# Altium footprint library TranDangKhoa-LIB.PcbLib: 1435 footprints (part 22 of 90)
Each footprint in its own frame and in the unit in brackets; x right, y up, seen from the top. Pads: shape width x height; smd on the part's side, far side on the other; paste and mask are expansions set on the pad; w line width, h text height; cw(c..) or ccw(c..) is an arc to the next point about the centre after c.
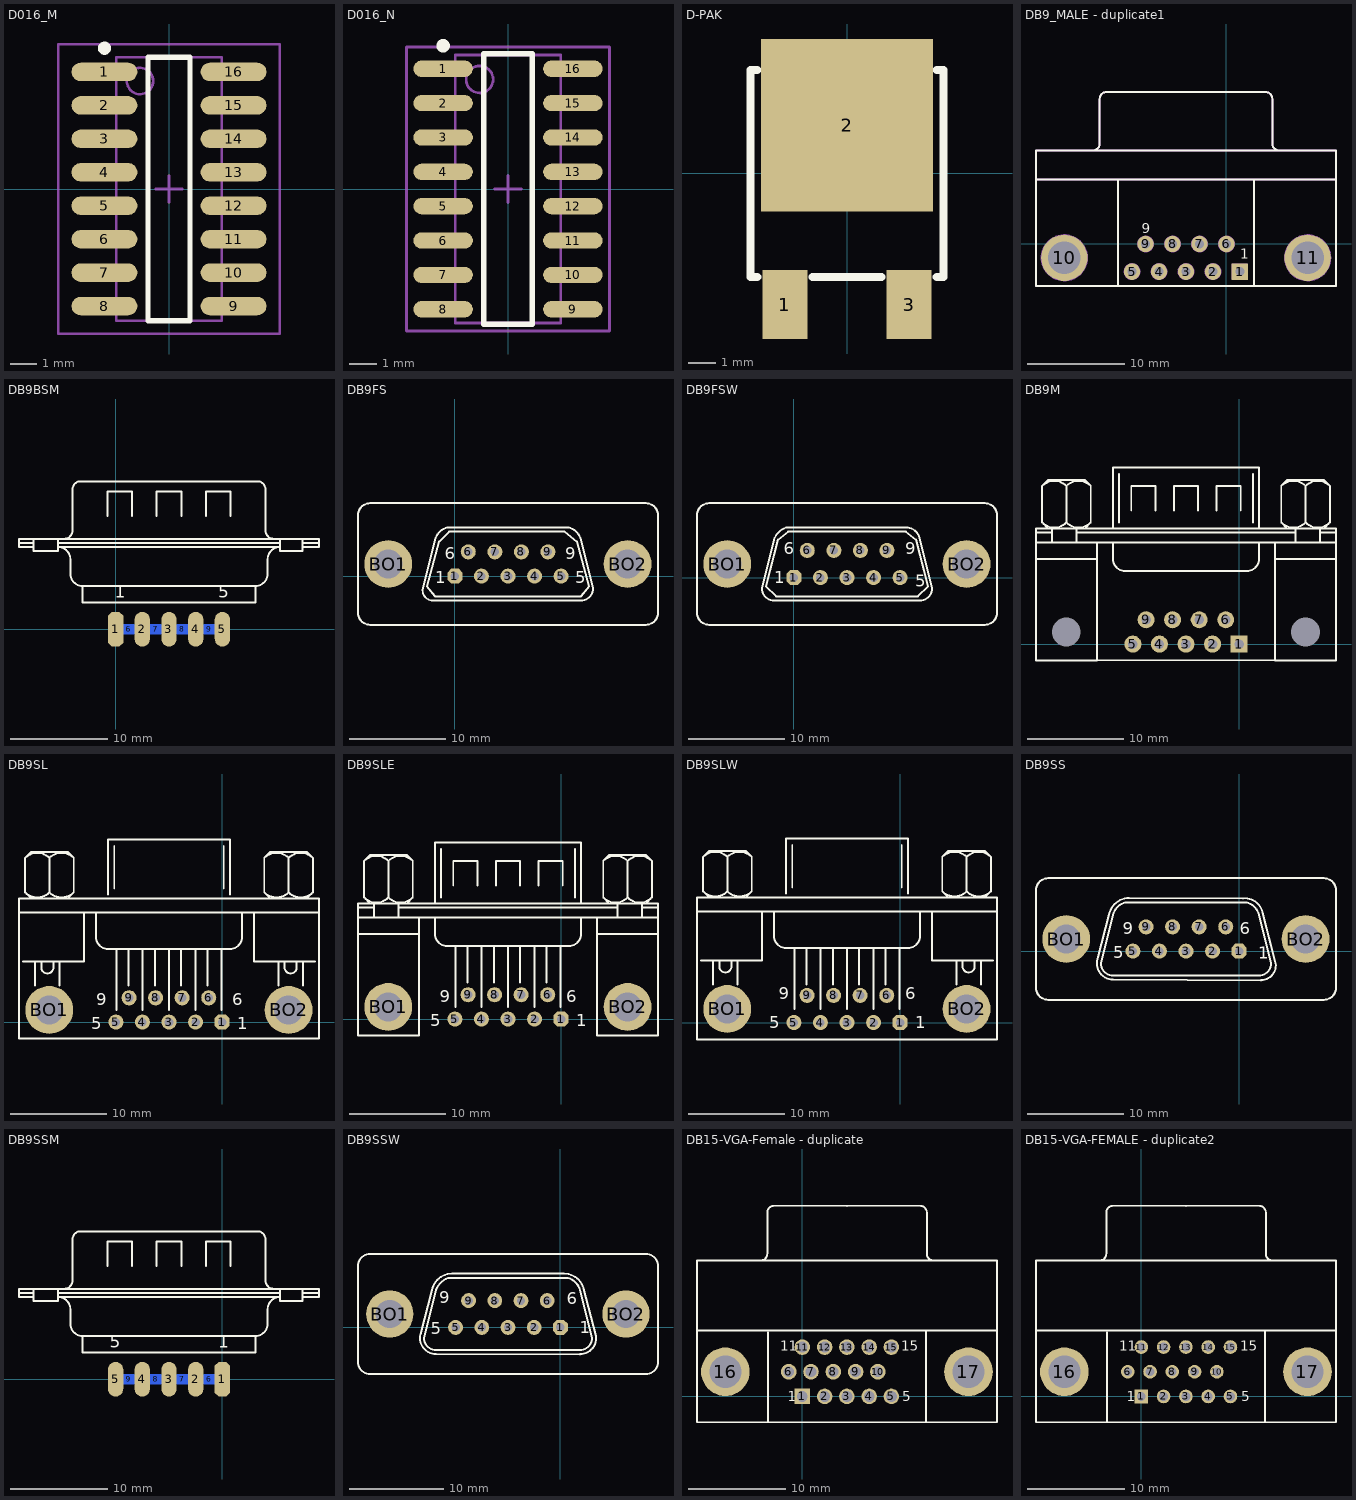
[diagram p21: the footprints below, top view; thin cyan lines are the x and y axes]

## D016_M [mm] "SOIC, 16-Leads, Body 9.9x3.9mm, Pitch 1.27mm, IPC Low Density"
height 1.75
pads (16):
  oval 2.5x0.7 smd: 1(-2.45,4.445) 2(-2.45,3.175) 3(-2.45,1.905) 4(-2.45,0.635) 5(-2.45,-0.635) 6(-2.45,-1.905) 7(-2.45,-3.175) 8(-2.45,-4.445) 9(2.45,-4.445) 10(2.45,-3.175) 11(2.45,-1.905) 12(2.45,-0.635) 13(2.45,0.635) 14(2.45,1.905) 15(2.45,3.175) 16(2.45,4.445)
Top Overlay:
  circle w0.25: c-2.45,5.345 r0.125
  lines w0.2: -0.8,-5 0.8,-5 0.8,5 -0.8,5 -0.8,-5
Mechanical 13:
  circle w0.1: c-1.1,4.1 r0.5
  lines w0.1: -2,-5 2,-5 2,5 -2,5 -2,-5
Mechanical 15:
  lines w0.1: -0.5,0 0.5,0 ; 0,-0.5 0,0.5 ; -4.2,-5.5 4.2,-5.5 4.2,5.5 -4.2,5.5 -4.2,-5.5
3D body: height 1.75, standoff 0, extent -2,-5 2,5

## D016_N [mm] "SOIC, 16-Leads, Body 9.9x3.9mm, Pitch 1.27mm, IPC Medium Density"
height 1.75
pads (16):
  oval 2.2x0.6 smd: 1(-2.4,4.445) 2(-2.4,3.175) 3(-2.4,1.905) 4(-2.4,0.635) 5(-2.4,-0.635) 6(-2.4,-1.905) 7(-2.4,-3.175) 8(-2.4,-4.445) 9(2.4,-4.445) 10(2.4,-3.175) 11(2.4,-1.905) 12(2.4,-0.635) 13(2.4,0.635) 14(2.4,1.905) 15(2.4,3.175) 16(2.4,4.445)
Top Overlay:
  circle w0.25: c-2.4,5.295 r0.125
  lines w0.2: -0.9,-5 0.9,-5 0.9,5 -0.9,5 -0.9,-5
Mechanical 13:
  circle w0.1: c-1.05,4.05 r0.5
  lines w0.1: -1.95,-4.95 1.95,-4.95 1.95,4.95 -1.95,4.95 -1.95,-4.95
Mechanical 15:
  lines w0.1: -0.5,0 0.5,0 ; 0,-0.5 0,0.5 ; -3.75,-5.25 3.75,-5.25 3.75,5.25 -3.75,5.25 -3.75,-5.25
3D body: height 1.75, standoff 0, extent -1.95,-4.95 1.95,4.95

## D-PAK [mil]
pads (3):
  rect 65x100 smd: 1(-90,-190) 3(90,-190)
  rect 250x250 smd: 2(0,70)
Top Overlay:
  lines w12: -130,-150 -140,-150 -140,150 -130,150 ; -50,-150 50,-150 ; 130,-150 140,-150 140,150 130,150
3D body "User Library-TO252AA.step": height 90.55, standoff -0.35, extent -130,-210.95 129.06,170.95

## DB9_MALE - duplicate1 [mm]
pads (11):
  rect 1.69x1.69 hole 0.9: 1(1.385,-2.84)
  round 1.69 hole 0.9: 2(-1.385,-2.84) 3(-4.155,-2.84) 4(-6.925,-2.84) 5(-9.695,-2.84) 6(0,0) 7(-2.77,0) 8(-5.54,0) 9(-8.31,0)
  round 4.76 hole 3.3: 10(-16.65,-1.42) 11(8.34,-1.42)
Top Overlay:
  lines w0.2: -19.555,6.604 11.245,6.604 ; -13.715,9.609 ccw(c-13.715,10.304) -13.02,10.304 -13.02,14.904 ; -13.015,14.909 cw(c-12.32,14.909) -12.32,15.604 4.01,15.604 cw(c4.01,14.909) 4.705,14.909 ; -11.155,-4.32 -11.155,6.604 ; 2.845,-4.32 2.845,6.604 ; 4.71,14.904 4.71,10.304 ccw(c5.405,10.304) 5.405,9.609 ; -19.555,-4.32 -19.555,9.604 11.245,9.604 11.245,-4.32 -19.555,-4.32
  text "1" at 1.4,-1.5 h1
  text "9" at -8.709,1.095 h1
Mechanical 7:
  circle w0.2: c-1.385,-2.84 r0.773
  circle w0.2: c-4.155,-2.84 r0.773
  circle w0.2: c-6.925,-2.84 r0.773
  circle w0.2: c-9.695,-2.84 r0.773
  circle w0.2: c-8.31,0 r0.773
  circle w0.2: c-5.54,0 r0.773
  circle w0.2: c-2.77,0 r0.773
  circle w0.2: c0,0 r0.773
  circle w0.2: c8.34,-1.42 r2.327
  circle w0.2: c-16.65,-1.42 r2.327
  lines w0.2: -19.555,6.604 11.245,6.604 ; -13.715,9.609 ccw(c-13.715,10.304) -13.02,10.304 -13.02,14.904 ; -13.015,14.909 cw(c-12.32,14.909) -12.32,15.604 4.01,15.604 cw(c4.01,14.909) 4.705,14.909 ; -11.155,-4.32 -11.155,6.604 ; 2.845,-4.32 2.845,6.604 ; 4.71,14.904 4.71,10.304 ccw(c5.405,10.304) 5.405,9.609 ; -19.555,-4.32 11.245,-4.32 11.245,9.604 -19.555,9.604 -19.555,-4.32 ; 0.635,-3.59 2.135,-3.59 2.135,-2.09 0.635,-2.09 0.635,-2.84 0.635,-3.59
3D body "SW3DPS-DB9RA_copy.STEP": height 12.66, standoff -3.39, extent -19.848,-4.328 11.466,16.376
3D body: height 4, standoff -3, extent -18.067,-1.549 -17.122,-1.095
3D body: height 4, standoff -3, extent -16.299,-1.641 -15.232,-0.912
3D body: height 4, standoff -3, extent 6.914,-1.537 7.981,-0.808
3D body: height 4, standoff -3, extent 8.804,-1.354 9.749,-0.899
3D body: height 4.5, standoff 4, extent 6.626,-0.892 10.169,5.789
3D body: height 4.5, standoff 4, extent -18.528,-1.113 -14.985,5.568

## DB9BSM [mm]
pads (9):
  oct 1.587x3.598 smd: 1(0,0)
  oval 1.587x3.598 smd: 2(2.752,0) 3(5.503,0) 4(8.255,0) 5(11.007,0)
  oval 2x1 smd far side: 6(1.376,0) 7(4.127,0) 8(6.879,0) 9(9.631,0)
Top Overlay:
  lines w0.203: -9.948,8.89 -8.467,8.89 ; -8.467,8.467 -9.948,8.467 -9.948,9.313 20.955,9.313 20.955,8.467 19.262,8.467 ; -8.467,9.313 -8.467,8.043 -5.927,8.043 -5.927,9.313 ; -5.927,8.89 16.933,8.89 ; -5.292,9.313 ccw(c-5.292,10.16) -4.445,10.16 -4.445,14.393 cw(c-3.598,14.393) -3.598,15.24 14.605,15.24 cw(c14.605,14.393) 15.452,14.393 15.452,10.16 ccw(c16.298,10.16) 16.298,9.313 ; -0.847,11.642 -0.847,14.182 1.693,14.182 1.693,11.642 ; 4.233,11.642 4.233,14.182 6.773,14.182 6.773,11.642 ; 9.313,11.642 9.313,14.182 11.853,14.182 11.853,11.642 ; 16.933,9.313 16.933,8.043 19.262,8.043 19.262,9.313 ; 19.262,8.89 20.955,8.89 ; -3.387,4.445 cw(c-3.387,5.715) -4.657,5.715 -4.657,7.197 ccw(c-5.927,7.197) -5.927,8.467 16.933,8.467 ccw(c16.933,7.197) 15.663,7.197 15.663,5.715 cw(c14.393,5.715) 14.393,4.445 ; -3.387,4.445 14.393,4.445 ; -3.387,4.445 -3.387,2.752 14.393,2.752 14.393,4.445
  text "5" at 10.583,3.26 h1.27
  text "1" at -0.085,3.26 h1.27

## DB9FS [mil]
pads (11):
  oct 62x62 hole 35: 1(0,0)
  round 62 hole 35: 2(109.17,0) 3(218.33,0) 4(327.5,0) 5(436.67,0) 6(55,100) 7(164.17,100) 8(273.33,100) 9(382.5,100)
  round 196.67 hole 118.33: BO1(-274.17,50) BO2(710,50)
Top Overlay:
  lines w8: -131.72,-50.22 ccw(c-90,-58.33) -81.89,-100.05 ; -131.67,-50 -81.67,150 ; -81.67,-100 518.33,-100 ccw(c518.33,-50) 568.33,-50 518.33,150 ; -81.3,149.86 cw(c-15,133.33) -31.53,199.64 ; -31.67,200 468.33,200 ; 468.2,199.64 cw(c451.67,133.33) 517.97,149.86 ; -398.33,-150 ccw(c-348.33,-150) -348.33,-200 785,-200 ccw(c785,-150) 835,-150 835,250 ccw(c785,250) 785,300 -348.33,300 ccw(c-348.33,250) -398.33,250 -398.33,-150 ; -115,-41.67 -81.67,-83.33 518.33,-83.33 551.67,-41.67 501.67,141.67 451.67,183.33 -23.33,183.33 -65,141.67 -115,-41.67
  text "9" at 454.03,70.2 h50
  text "6" at -41.67,70 h50
  text "5" at 494.63,-29.7 h50
  text "1" at -81.67,-30 h50

## DB9FSW [mil]
pads (11):
  oct 62x62 hole 35: 1(0,0)
  round 62 hole 35: 2(109.17,0) 3(218.33,0) 4(327.5,0) 5(436.67,0) 6(55,111.67) 7(164.17,111.67) 8(273.33,111.67) 9(382.5,111.67)
  round 196.67 hole 118.33: BO1(-274.17,55.83) BO2(710,55.83)
Top Overlay:
  lines w8: -398.33,255.83 cw(c-348.33,255.83) -348.33,305.83 785,305.83 cw(c785,255.83) 835,255.83 835,-144.17 cw(c785,-144.17) 785,-194.17 -348.33,-194.17 cw(c-348.33,-144.17) -398.33,-144.17 -398.33,264.17 ; -81.67,155.83 -131.67,-44.17 ccw(c-81.67,-44.17) -81.67,-94.17 518.33,-94.17 ccw(c518.33,-44.17) 568.33,-44.17 518.33,155.83 ; -78.99,163.03 cw(c-6.67,130.83) -31.13,206.12 ; -31.67,205.83 468.33,205.83 ; 468.23,206.09 cw(c460,147.5) 518.59,155.73 ; -115,-35.83 -65,155.83 -23.33,189.17 460,189.17 501.67,155.83 551.67,-35.83 510,-77.5 -73.33,-77.5 -115,-35.83
  text "6" at -41.67,95.83 h50
  text "1" at -81.67,-24.17 h50
  text "5" at 499.33,-37.97 h50
  text "9" at 458.33,95.83 h50

## DB9M [mil]
pads (11):
  rect 70x70 hole 39.37 unplated: 1(0,0)
  round 70 hole 39.37 unplated: 2(-109.17,0) 3(-218.33,0) 4(-327.5,0) 5(-436.67,0) 6(-55,100) 7(-164.17,100) 8(-273.33,100) 9(-382.5,100)
  round 70 hole 118.11 unplated: ""(-710.83,50) ""(273.33,50)
Top Overlay:
  lines w7.87: -619,-66.67 210,-66.67
  lines w8: -835,350 -585,350 ; -835,416.67 398.33,416.67 ; -835,458.33 -768.33,458.33 ; -810.09,499.91 ccw(c-760,550) -709.91,499.91 ; -810.09,650.09 cw(c-760,600) -709.91,650.09 ; -785,475 -810,500 -810,650 -785,675 -635,675 -610,650 -610,500 -635,475 ; -768.33,416.67 -768.33,475 ; -710.09,499.91 ccw(c-660,550) -609.91,499.91 ; -710.09,650.09 cw(c-660,600) -609.91,650.09 ; -710,500 -710,650 ; -668.33,416.67 -668.33,475 ; -668.33,458.33 231.67,458.33 ; -585,416.67 -585,-66.67 -835,-66.67 -835,475 398.33,475 398.33,-66.67 148.33,-66.67 148.33,416.67 ; -518.33,416.67 -518.33,350 ccw(c-468.33,350) -468.33,300 31.67,300 ccw(c31.67,350) 81.67,350 81.67,416.67 ; -518.33,475 -518.33,725 81.67,725 81.67,475 ; -493.33,500 -493.33,700 ; -443.33,550 -443.33,650 -343.33,650 -343.33,550 ; -268.33,550 -268.33,650 -168.33,650 -168.33,550 ; -93.33,550 -93.33,650 6.67,650 6.67,550 ; 56.67,500 56.67,700 ; 148.33,350 398.33,350 ; 173.25,499.91 ccw(c223.33,550) 273.42,499.91 ; 173.25,650.09 cw(c223.33,600) 273.42,650.09 ; 198.33,475 173.33,500 173.33,650 198.33,675 348.33,675 373.33,650 373.33,500 348.33,475 ; 231.67,416.67 231.67,475 ; 273.25,499.91 ccw(c323.33,550) 373.42,499.91 ; 273.25,650.09 cw(c323.33,600) 373.42,650.09 ; 273.33,500 273.33,650 ; 331.67,416.67 331.67,475 ; 331.67,458.33 398.33,458.33

## DB9SL [mil]
pads (11):
  oct 62x62 hole 35: 1(0,0)
  round 62 hole 35: 2(-109.17,0) 3(-218.33,0) 4(-327.5,0) 5(-436.67,0) 6(-55,100) 7(-164.17,100) 8(-273.33,100) 9(-382.5,100)
  round 196.67 hole 118.33: BO1(-710.83,50) BO2(273.33,50)
Top Overlay:
  lines w8: -835,450 398.33,450 ; -818.33,250 -568.33,250 -568.33,450 ; -810.09,533.25 ccw(c-760,583.33) -709.91,533.25 ; -810.09,675.09 cw(c-760,625) -709.91,675.09 ; -785,508.33 -810,533.33 -810,675 -785,700 -635,700 -610,675 -610,533.33 -635,508.33 ; -768.33,150 -768.33,250 ; -743.33,250 -743.33,225 ccw(c-718.33,225) -693.33,225 -693.33,250 ; -710.09,533.25 ccw(c-660,583.33) -609.91,533.25 ; -710.09,675.09 cw(c-660,625) -609.91,675.09 ; -710,533.33 -710,675 ; -668.33,150 -668.33,250 ; -518.33,450 -518.33,350 ccw(c-468.33,350) -468.33,300 31.67,300 ccw(c31.67,350) 81.67,350 81.67,450 ; -468.33,525 -468.33,750 31.67,750 31.67,525 ; -443.33,550 -443.33,725 ; -435,50 -435,300 ; -385,150 -385,300 ; -326.67,50 -326.67,300 ; -276.67,150 -276.67,300 ; -218.33,50 -218.33,300 ; -168.33,150 -168.33,300 ; -110,50 -110,300 ; -60,150 -60,158.33 -60,300 ; -1.67,50 -1.67,300 ; 6.67,550 6.67,725 ; 131.67,450 131.67,250 381.67,250 ; 173.25,533.25 ccw(c223.33,583.33) 273.42,533.25 ; 173.25,675.09 cw(c223.33,625) 273.42,675.09 ; 198.33,508.33 173.33,533.33 173.33,675 198.33,700 348.33,700 373.33,675 373.33,533.33 348.33,508.33 ; 231.67,150 231.67,250 ; 256.67,250 256.67,225 ccw(c281.67,225) 306.67,225 306.67,250 ; 273.25,533.25 ccw(c323.33,583.33) 373.42,533.25 ; 273.25,675.09 cw(c323.33,625) 373.42,675.09 ; 273.33,533.33 273.33,675 ; 331.67,150 331.67,250 ; -835,-66.67 -835,508.33 398.33,508.33 398.33,-66.67 -835,-66.67
  text "9" at -518.33,70 h50
  text "5" at -538.33,-30 h50
  text "1" at 61.67,-30 h50
  text "6" at 41.67,70 h50

## DB9SLE [mil]
pads (11):
  oct 62x62 hole 35: 1(0,0)
  round 62 hole 35: 2(-109.17,0) 3(-218.33,0) 4(-327.5,0) 5(-436.67,0) 6(-55,100) 7(-164.17,100) 8(-273.33,100) 9(-382.5,100)
  round 196.67 hole 118.33: BO1(-710.83,50) BO2(273.33,50)
Top Overlay:
  lines w8: -835,350 -585,350 ; -835,416.67 398.33,416.67 ; -835,458.33 -768.33,458.33 ; -810.09,499.91 ccw(c-760,550) -709.91,499.91 ; -810.09,650.09 cw(c-760,600) -709.91,650.09 ; -785,475 -810,500 -810,650 -785,675 -635,675 -610,650 -610,500 -635,475 ; -768.33,416.67 -768.33,475 ; -710.09,499.91 ccw(c-660,550) -609.91,499.91 ; -710.09,650.09 cw(c-660,600) -609.91,650.09 ; -710,500 -710,650 ; -668.33,416.67 -668.33,475 ; -668.33,458.33 231.67,458.33 ; -585,416.67 -585,-66.67 -835,-66.67 -835,475 398.33,475 398.33,-66.67 148.33,-66.67 148.33,416.67 ; -518.33,416.67 -518.33,350 ccw(c-468.33,350) -468.33,300 31.67,300 ccw(c31.67,350) 81.67,350 81.67,416.67 ; -518.33,475 -518.33,725 81.67,725 81.67,475 ; -493.33,500 -493.33,700 ; -443.33,550 -443.33,650 -343.33,650 -343.33,550 ; -435,50 -435,300 ; -385,150 -385,300 ; -326.67,50 -326.67,300 ; -276.67,150 -276.67,300 ; -268.33,550 -268.33,650 -168.33,650 -168.33,550 ; -218.33,50 -218.33,300 ; -168.33,150 -168.33,300 ; -110,50 -110,300 ; -93.33,550 -93.33,650 6.67,650 6.67,550 ; -60,150 -60,300 ; -1.67,50 -1.67,300 ; 56.67,500 56.67,700 ; 148.33,350 398.33,350 ; 173.25,499.91 ccw(c223.33,550) 273.42,499.91 ; 173.25,650.09 cw(c223.33,600) 273.42,650.09 ; 198.33,475 173.33,500 173.33,650 198.33,675 348.33,675 373.33,650 373.33,500 348.33,475 ; 231.67,416.67 231.67,475 ; 273.25,499.91 ccw(c323.33,550) 373.42,499.91 ; 273.25,650.09 cw(c323.33,600) 373.42,650.09 ; 273.33,500 273.33,650 ; 331.67,416.67 331.67,475 ; 331.67,458.33 398.33,458.33
  text "9" at -498.33,70 h50
  text "5" at -538.33,-30 h50
  text "6" at 21.67,70 h50
  text "1" at 61.67,-30 h50

## DB9SLW [mil]
pads (11):
  oct 62x62 hole 35: 1(0,0)
  round 62 hole 35: 2(-109.17,0) 3(-218.33,0) 4(-327.5,0) 5(-436.67,0) 6(-55,111.67) 7(-164.17,111.67) 8(-273.33,111.67) 9(-382.5,111.67)
  round 196.67 hole 118.33: BO1(-710.83,55.83) BO2(273.33,55.83)
Top Overlay:
  lines w8: -835,455.83 398.33,455.83 ; -818.33,255.83 -568.33,255.83 -568.33,455.83 ; -810.09,539.08 ccw(c-760,589.17) -709.91,539.08 ; -810.09,680.92 cw(c-760,630.83) -709.91,680.92 ; -785,514.17 -810,539.17 -810,680.83 -785,705.83 -635,705.83 -610,680.83 -610,539.17 -635,514.17 ; -768.33,155.83 -768.33,255.83 ; -743.33,255.83 -743.33,230.83 ccw(c-718.33,230.83) -693.33,230.83 -693.33,255.83 ; -710.09,539.08 ccw(c-660,589.17) -609.91,539.08 ; -710.09,680.92 cw(c-660,630.83) -609.91,680.92 ; -710,539.17 -710,680.83 ; -668.33,155.83 -668.33,255.83 ; -518.33,455.83 -518.33,355.83 ccw(c-468.33,355.83) -468.33,305.83 31.67,305.83 ccw(c31.67,355.83) 81.67,355.83 81.67,455.83 ; -468.33,530.83 -468.33,755.83 31.67,755.83 31.67,530.83 ; -443.33,555.83 -443.33,730.83 ; -435,55.83 -435,305.83 ; -385,155.83 -385,305.83 ; -326.67,55.83 -326.67,305.83 ; -276.67,155.83 -276.67,305.83 ; -218.33,55.83 -218.33,305.83 ; -168.33,155.83 -168.33,305.83 ; -110,55.83 -110,305.83 ; -60,155.83 -60,305.83 ; -1.67,55.83 -1.67,305.83 ; 6.67,555.83 6.67,730.83 ; 131.67,455.83 131.67,255.83 381.67,255.83 ; 173.25,539.08 ccw(c223.33,589.17) 273.42,539.08 ; 173.25,680.92 cw(c223.33,630.83) 273.42,680.92 ; 198.33,514.17 173.33,539.17 173.33,680.83 198.33,705.83 348.33,705.83 373.33,680.83 373.33,539.17 348.33,514.17 ; 231.67,155.83 231.67,255.83 ; 256.67,255.83 256.67,230.83 ccw(c281.67,230.83) 306.67,230.83 306.67,255.83 ; 273.25,539.08 ccw(c323.33,589.17) 373.42,539.08 ; 273.25,680.92 cw(c323.33,630.83) 373.42,680.92 ; 273.33,539.17 273.33,680.83 ; 331.67,155.83 331.67,255.83 ; -835,-69.17 398.33,-69.17 398.33,514.17 -835,514.17 -835,-69.17
  text "6" at 21.67,95.83 h50
  text "1" at 61.67,-24.17 h50
  text "5" at -538.33,-24.17 h50
  text "9" at -498.33,95.83 h50

## DB9SS [mil]
pads (11):
  oct 62x62 hole 35: 1(0,0)
  round 62 hole 35: 2(-109.17,0) 3(-218.33,0) 4(-327.5,0) 5(-436.67,0) 6(-55,100) 7(-164.17,100) 8(-273.33,100) 9(-382.5,100)
  round 196.67 hole 118.33: BO1(-710.83,50) BO2(273.33,50)
Top Overlay:
  lines w8: -580,-23.33 -535,150 ; -579.7,-23.95 ccw(c-518.33,-50) -518.33,-116.67 90,-120 ; -535.1,149.55 cw(c-451.67,133.33) -451.67,218.33 15,216.67 ; -518.33,150 -568.33,-50 ccw(c-518.33,-50) -518.33,-100 81.67,-100 ccw(c81.67,-50) 131.67,-50 81.67,150 ; -517.97,149.86 cw(c-451.67,133.33) -468.2,199.64 ; -468.33,200 31.67,200 ; 15.41,217.08 cw(c23.33,141.67) 97.22,158.72 ; 31.53,199.64 cw(c15,133.33) 81.3,149.86 ; 90,-119.17 ccw(c90,-58.33) 148.48,-41.57 ; 96.67,158.33 148.33,-41.67 ; -835,-150 ccw(c-785,-150) -785,-200 348.33,-200 ccw(c348.33,-150) 398.33,-150 398.33,250 ccw(c348.33,250) 348.33,300 -785,300 ccw(c-785,250) -835,250 -835,-150
  text "9" at -478.33,70 h50
  text "5" at -518.33,-30 h50
  text "1" at 78.27,-31.3 h50
  text "6" at 1.67,70 h50

## DB9SSM [mm]
pads (9):
  oct 1.587x3.598 smd: 1(0,0)
  oval 1.587x3.598 smd: 2(-2.752,0) 3(-5.503,0) 4(-8.255,0) 5(-11.007,0)
  oval 2x1 smd far side: 6(-1.376,0) 7(-4.127,0) 8(-6.879,0) 9(-9.631,0)
Top Overlay:
  lines w0.203: -20.955,8.89 -19.473,8.89 ; -19.473,8.467 -20.955,8.467 -20.955,9.313 9.948,9.313 9.948,8.467 8.255,8.467 ; -19.473,9.313 -19.473,8.043 -16.933,8.043 -16.933,9.313 ; -16.933,8.89 5.927,8.89 ; -16.298,9.313 ccw(c-16.298,10.16) -15.452,10.16 -15.452,14.393 cw(c-14.605,14.393) -14.605,15.24 3.598,15.24 cw(c3.598,14.393) 4.445,14.393 4.445,10.16 ccw(c5.292,10.16) 5.292,9.313 ; -11.853,11.642 -11.853,14.182 -9.313,14.182 -9.313,11.642 ; -6.773,11.642 -6.773,14.182 -4.233,14.182 -4.233,11.642 ; -1.693,11.642 -1.693,14.182 0.847,14.182 0.847,11.642 ; 5.927,9.313 5.927,8.043 8.255,8.043 8.255,9.313 ; 8.255,8.89 9.948,8.89 ; -14.393,4.445 cw(c-14.393,5.715) -15.663,5.715 -15.663,7.197 ccw(c-16.933,7.197) -16.933,8.467 5.927,8.467 ccw(c5.927,7.197) 4.657,7.197 4.657,5.715 cw(c3.387,5.715) 3.387,4.445 ; -14.393,4.445 3.387,4.445 ; -14.393,4.445 -14.393,2.752 3.387,2.752 3.387,4.445
  text "1" at -0.423,3.26 h1.27
  text "5" at -11.599,3.26 h1.27

## DB9SSW [mil]
pads (11):
  oct 62x62 hole 35: 1(0,0)
  round 62 hole 35: 2(-109.17,0) 3(-218.33,0) 4(-327.5,0) 5(-436.67,0) 6(-55,111.67) 7(-164.17,111.67) 8(-273.33,111.67) 9(-382.5,111.67)
  round 196.67 hole 118.33: BO1(-710.83,55.83) BO2(273.33,55.83)
Top Overlay:
  lines w8: -583.33,-29.17 -535,155.83 ; -583.02,-28.04 ccw(c-518.33,-44.17) -518.33,-110.83 81.67,-112.5 ; -535.1,155.38 cw(c-451.67,139.17) -451.67,224.17 15,224.17 cw(c15,139.17) 96.29,164.02 ; -518.45,156.21 cw(c-435,122.5) -468.71,205.95 ; -518.33,155.83 -568.33,-44.17 ccw(c-518.33,-44.17) -518.33,-94.17 81.67,-94.17 ccw(c81.67,-44.17) 131.67,-44.17 81.67,155.83 ; -468.33,205.83 31.67,205.83 ; 31.53,205.47 cw(c15,139.17) 81.3,155.7 ; 81.67,-111.67 ccw(c81.67,-44.17) 148.66,-35.94 ; 96.67,162.5 148.33,-35.83 ; -843.33,-144.17 ccw(c-793.33,-144.17) -793.33,-194.17 356.67,-194.17 ccw(c356.67,-144.17) 406.67,-144.17 406.67,255.83 ccw(c356.67,255.83) 356.67,305.83 -793.33,305.83 ccw(c-793.33,255.83) -843.33,255.83 -843.33,-144.17
  text "6" at 27.27,95.73 h50
  text "1" at 81.07,-24.47 h50
  text "5" at -540.83,-29.27 h50
  text "9" at -504.43,100.53 h50

## DB15-VGA-Female - duplicate [mm] "High density D sub 15 pin Female connector"
height 1
pads (17):
  rect 1.6x1.6 hole 1.1: 1(0,0)
  round 1.6 hole 1.1: 2(2.29,0) 3(4.58,0) 4(6.87,0) 5(9.16,0) 6(-1.4,2.54) 7(0.89,2.54) 8(3.18,2.54) 9(5.47,2.54) 10(7.76,2.54) 11(0,5.08) 12(2.29,5.08) 13(4.58,5.08) 14(6.87,5.08) 15(9.16,5.08)
  round 5 hole 3.3: 16(-7.915,2.54) 17(17.075,2.54)
Top Overlay:
  lines w0.2: -10.83,6.77 20.01,6.77 ; -4.3,13.975 ccw(c-4.3,14.67) -3.605,14.67 -3.605,18.91 cw(c-2.91,18.91) -2.91,19.605 4.595,19.59 12.1,19.605 cw(c12.1,18.91) 12.795,18.91 12.795,14.67 ccw(c13.49,14.67) 13.49,13.975 ; -3.535,-2.65 -3.535,6.57 ; 12.725,-2.65 12.725,6.65 ; -10.83,-2.65 -10.83,13.97 20.01,13.97 20.01,-2.65 -10.83,-2.65
  text "11" at -2.286,4.699 h1
  text "5" at 10.287,-0.508 h1
  text "15" at 10.16,4.699 h1
  text "1" at -1.524,-0.508 h1

## DB15-VGA-FEMALE - duplicate2 [mm]
pads (17):
  rect 1.4x1.4 hole 0.9: 1(0,0)
  round 1.4 hole 0.9: 2(2.29,0) 3(4.58,0) 4(6.87,0) 5(9.16,0) 6(-1.4,2.54) 7(0.89,2.54) 8(3.18,2.54) 9(5.47,2.54) 10(7.76,2.54) 11(0,5.08) 12(2.29,5.08) 13(4.58,5.08) 14(6.87,5.08) 15(9.16,5.08)
  round 5 hole 3.3: 16(-7.915,2.54) 17(17.075,2.54)
Top Overlay:
  lines w0.2: -10.83,6.77 20.01,6.77 ; -4.3,13.975 ccw(c-4.3,14.67) -3.605,14.67 -3.605,18.91 cw(c-2.91,18.91) -2.91,19.605 4.595,19.59 12.1,19.605 cw(c12.1,18.91) 12.795,18.91 12.795,14.67 ccw(c13.49,14.67) 13.49,13.975 ; -3.535,-2.65 -3.535,6.57 ; 12.725,-2.65 12.725,6.65 ; -10.83,-2.65 20.01,-2.65 20.01,13.97 -10.83,13.97 -10.83,-2.65
  text "1" at -1.524,-0.508 h1
  text "11" at -2.286,4.699 h1
  text "5" at 10.287,-0.508 h1
  text "15" at 10.16,4.699 h1
3D body "SW3dPS-vga connector.STEP": height 14.3, standoff -0.79, extent -12.272,14.986 21.416,60.116
3D body "DB15 Analog RGB.stp": height 12.75, standoff -3.75, extent -10.935,-1.672 20.065,20.828